# Altium footprint library Phoenix.PcbLib: 25 footprints (part 2 of 2)
Each footprint in its own frame and in the unit in brackets; x right, y up, seen from the top. Pads: shape width x height; smd on the part's side, far side on the other; paste and mask are expansions set on the pad; w line width, h text height; cw(c..) or ccw(c..) is an arc to the next point about the centre after c.
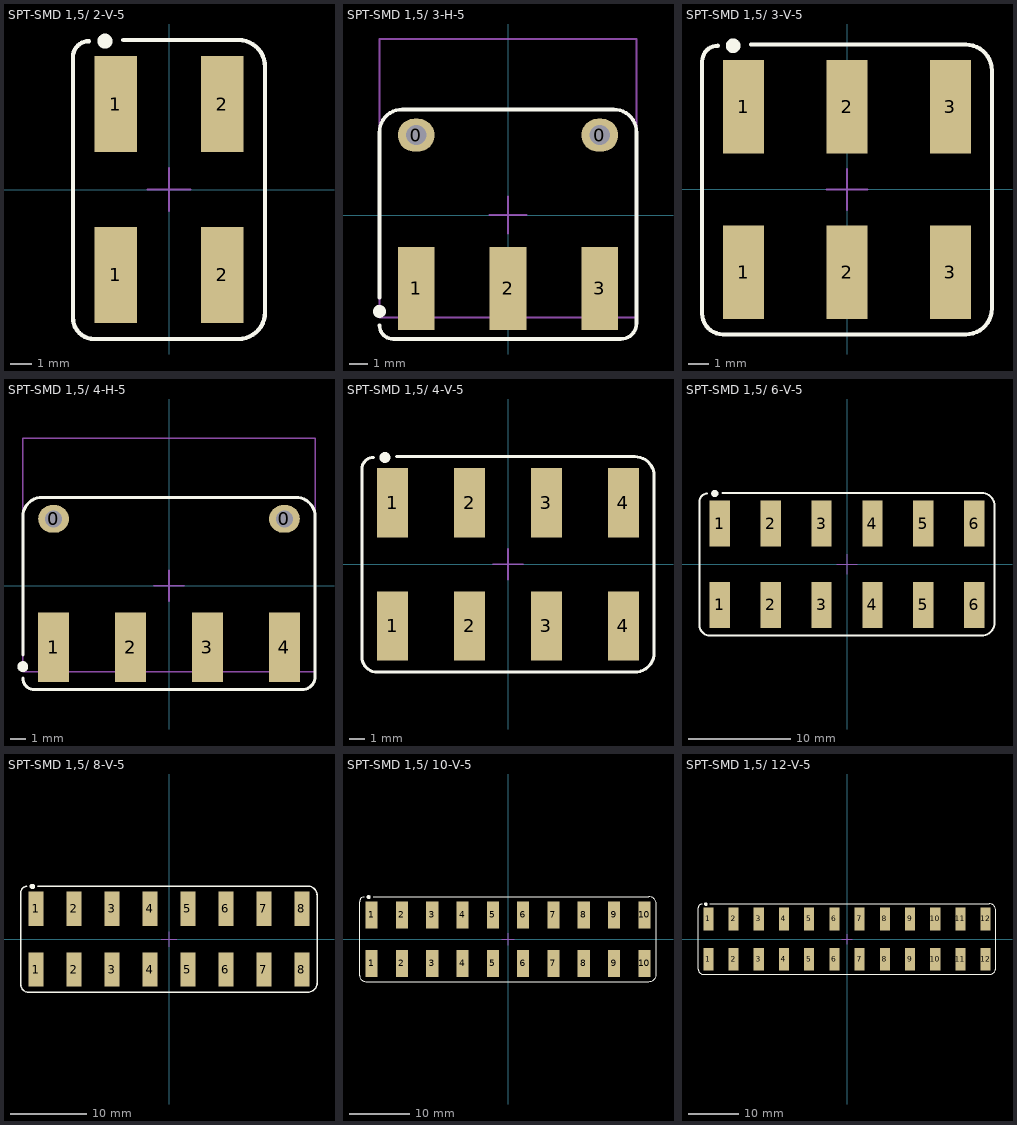
[diagram p1: the footprints below, top view; thin cyan lines are the x and y axes]

## SPT-SMD 1,5/ 2-V-5 [mm] "PCB Terminal Block, 2 Position, Pitch 5"
pads (4):
  rect 2x4.5 smd: 1(-2.5,-4) 1(-2.5,4) 2(2.5,-4) 2(2.5,4)
Top Overlay:
  circle w0.5: c-3,6.948 r0.1
  lines w0.2: -3.75,6.948 ccw(c-3.75,6.198) -4.5,6.198 -4.5,-6 ccw(c-3.5,-6) -3.5,-7 3.25,-7 ccw(c3.25,-5.75) 4.5,-5.75 4.5,5.75 ccw(c3.25,5.75) 3.25,7 -2.146,7
Mechanical 15:
  lines w0.1: -1,0 1,0 ; 0,-1 0,1
3D body "1824307.stp": height 13.62, standoff 0, extent -4.5,-5.7 4.5,5.7

## SPT-SMD 1,5/ 3-H-5 [mm] "PCB Terminal Block, 3 Position, Pitch 5, Horizontal"
pads (5):
  oval 2x1.8 hole 1.1 unplated: 0(-5,4.35) 0(5,4.35)
  rect 2x4.5 smd: 1(-5,-4) 2(0,-4) 3(5,-4)
Top Overlay:
  circle w0.5: c-7,-5.25 r0.1
  lines w0.2: -7,-6 ccw(c-6.25,-6) -6.25,-6.75 6.146,-6.75 ccw(c6.146,-5.896) 7,-5.896 7,4.5 ccw(c5.75,4.5) 5.75,5.75 -5.75,5.75 ccw(c-5.75,4.5) -7,4.5 -7,-4.5
Mechanical 13:
  lines w0.1: -7,-5.585 7,-5.585 7,9.585 -7,9.585 -7,-5.585
Mechanical 15:
  lines w0.1: -1,0 1,0 ; 0,-1 0,1
3D body "1824750_01.stp": height 7.7, standoff -2, extent -7,-5.585 7,9.585

## SPT-SMD 1,5/ 3-V-5 [mm] "PCB Terminal Block, 3 Position, Pitch 5"
pads (6):
  rect 2x4.5 smd: 1(-5,-4) 1(-5,4) 2(0,-4) 2(0,4) 3(5,-4) 3(5,4)
Top Overlay:
  circle w0.5: c-5.5,6.948 r0.1
  lines w0.2: -6.25,6.948 ccw(c-6.25,6.198) -7,6.198 -7,-6 ccw(c-6,-6) -6,-7 5.75,-7 ccw(c5.75,-5.75) 7,-5.75 7,5.75 ccw(c5.75,5.75) 5.75,7 -4.646,7
Mechanical 15:
  lines w0.1: -1,0 1,0 ; 0,-1 0,1
3D body "1824310.stp": height 13.62, standoff 0, extent -6.95,-5.5 7.05,5.9

## SPT-SMD 1,5/ 4-H-5 [mm] "PCB Terminal Block, 4 Position, Pitch 5, Horizontal"
pads (6):
  oval 2x1.8 hole 1.1 unplated: 0(-7.5,4.35) 0(7.5,4.35)
  rect 2x4.5 smd: 1(-7.5,-4) 2(-2.5,-4) 3(2.5,-4) 4(7.5,-4)
Top Overlay:
  circle w0.5: c-9.5,-5.25 r0.1
  lines w0.2: -9.5,-6 ccw(c-8.75,-6) -8.75,-6.75 8.646,-6.75 ccw(c8.646,-5.896) 9.5,-5.896 9.5,4.5 ccw(c8.25,4.5) 8.25,5.75 -8.25,5.75 ccw(c-8.25,4.5) -9.5,4.5 -9.5,-4.5
Mechanical 13:
  lines w0.1: -9.5,-5.585 -9.5,9.585 9.5,9.585 9.5,-5.585 -9.5,-5.585
Mechanical 15:
  lines w0.1: -1,0 1,0 ; 0,-1 0,1
3D body "pxc_1824763_02_SPT-SMD-1-5-4-H-5-0-R44_3D.stp": height 7.85, standoff -1.85, extent -9.52,-4.9 9.52,9.569

## SPT-SMD 1,5/ 4-V-5 [mm] "PCB Terminal Block, 4 Position, Pitch 5"
pads (8):
  rect 2x4.5 smd: 1(-7.5,-4) 1(-7.5,4) 2(-2.5,-4) 2(-2.5,4) 3(2.5,-4) 3(2.5,4) 4(7.5,-4) 4(7.5,4)
Top Overlay:
  circle w0.5: c-8,6.948 r0.1
  lines w0.2: -8.75,6.948 ccw(c-8.75,6.198) -9.5,6.198 -9.5,-6 ccw(c-8.5,-6) -8.5,-7 8.25,-7 ccw(c8.25,-5.75) 9.5,-5.75 9.5,5.75 ccw(c8.25,5.75) 8.25,7 -7.25,7
Mechanical 15:
  lines w0.1: -1,0 1,0 ; 0,-1 0,1
3D body "1824323_01.stp": height 13.62, standoff 0, extent -9.475,-5.5 9.525,5.9

## SPT-SMD 1,5/ 6-V-5 [mm] "PCB Terminal Block, 6 Position, Pitch 5"
pads (12):
  rect 2x4.5 smd: 1(-12.5,-4) 1(-12.5,4) 2(-7.5,-4) 2(-7.5,4) 3(-2.5,-4) 3(-2.5,4) 4(2.5,-4) 4(2.5,4) 5(7.5,-4) 5(7.5,4) 6(12.5,-4) 6(12.5,4)
Top Overlay:
  circle w0.5: c-13,6.948 r0.1
  lines w0.2: -13.75,6.948 ccw(c-13.75,6.198) -14.5,6.198 -14.5,-6 ccw(c-13.5,-6) -13.5,-7 13.25,-7 ccw(c13.25,-5.75) 14.5,-5.75 14.5,5.75 ccw(c13.25,5.75) 13.25,7 -12.25,7
Mechanical 15:
  lines w0.1: -1,0 1,0 ; 0,-1 0,1
3D body "1824349.stp": height 13.62, standoff 0, extent -14.5,-5.5 14.5,5.9

## SPT-SMD 1,5/ 8-V-5 [mm] "PCB Terminal Block, 8 Position, Pitch 5"
pads (16):
  rect 2x4.5 smd: 1(-17.5,-4) 1(-17.5,4) 2(-12.5,-4) 2(-12.5,4) 3(-7.5,-4) 3(-7.5,4) 4(-2.5,-4) 4(-2.5,4) 5(2.5,-4) 5(2.5,4) 6(7.5,-4) 6(7.5,4) 7(12.5,-4) 7(12.5,4) 8(17.5,-4) 8(17.5,4)
Top Overlay:
  circle w0.5: c-18,6.948 r0.1
  lines w0.2: -18.75,6.948 ccw(c-18.75,6.198) -19.5,6.198 -19.5,-6 ccw(c-18.5,-6) -18.5,-7 18.25,-7 ccw(c18.25,-5.75) 19.5,-5.75 19.5,5.75 ccw(c18.25,5.75) 18.25,7 -17.25,7
Mechanical 15:
  lines w0.1: -1,0 1,0 ; 0,-1 0,1
3D body "1824365.stp": height 13.62, standoff 0, extent -19.45,-5.5 19.55,5.9

## SPT-SMD 1,5/ 10-V-5 [mm] "PCB Terminal Block, 10 Position, Pitch 5"
pads (20):
  rect 2x4.5 smd: 1(-22.5,-4) 1(-22.5,4) 2(-17.5,-4) 2(-17.5,4) 3(-12.5,-4) 3(-12.5,4) 4(-7.5,-4) 4(-7.5,4) 5(-2.5,-4) 5(-2.5,4) 6(2.5,-4) 6(2.5,4) 7(7.5,-4) 7(7.5,4) 8(12.5,-4) 8(12.5,4) 9(17.5,-4) 9(17.5,4) 10(22.5,-4) 10(22.5,4)
Top Overlay:
  circle w0.5: c-23,6.948 r0.1
  lines w0.2: -23.75,6.948 ccw(c-23.75,6.198) -24.5,6.198 -24.5,-6 ccw(c-23.5,-6) -23.5,-7 23.25,-7 ccw(c23.25,-5.75) 24.5,-5.75 24.5,5.75 ccw(c23.25,5.75) 23.25,7 -22.25,7
Mechanical 15:
  lines w0.1: -1,0 1,0 ; 0,-1 0,1
3D body "1824381.stp": height 13.62, standoff 0, extent -24.5,-5.4 24.5,6

## SPT-SMD 1,5/ 12-V-5 [mm] "PCB Terminal Block, 12 Position, Pitch 5"
pads (24):
  rect 2x4.5 smd: 1(-27.5,-4) 1(-27.5,4) 2(-22.5,-4) 2(-22.5,4) 3(-17.5,-4) 3(-17.5,4) 4(-12.5,-4) 4(-12.5,4) 5(-7.5,-4) 5(-7.5,4) 6(-2.5,-4) 6(-2.5,4) 7(2.5,-4) 7(2.5,4) 8(7.5,-4) 8(7.5,4) 9(12.5,-4) 9(12.5,4) 10(17.5,-4) 10(17.5,4) 11(22.5,-4) 11(22.5,4) 12(27.5,-4) 12(27.5,4)
Top Overlay:
  circle w0.5: c-28,6.948 r0.1
  lines w0.2: -28.75,6.948 ccw(c-28.75,6.198) -29.5,6.198 -29.5,-6 ccw(c-28.5,-6) -28.5,-7 28.25,-7 ccw(c28.25,-5.75) 29.5,-5.75 29.5,5.75 ccw(c28.25,5.75) 28.25,7 -27.25,7
Mechanical 15:
  lines w0.1: -1,0 1,0 ; 0,-1 0,1
3D body "1824404.stp": height 13.62, standoff 0, extent -29.5,-5.775 29.5,5.625